# Altium footprint library Wurth_Elektronik_Electromechanic_Wire_to_Board_Connectors_rev16a.PCBLIB: 662 footprints (part 16 of 42)
Each footprint in its own frame and in the unit in brackets; x right, y up, seen from the top. Pads: shape width x height; smd on the part's side, far side on the other; paste and mask are expansions set on the pad; w line width, h text height; cw(c..) or ccw(c..) is an arc to the next point about the centre after c.
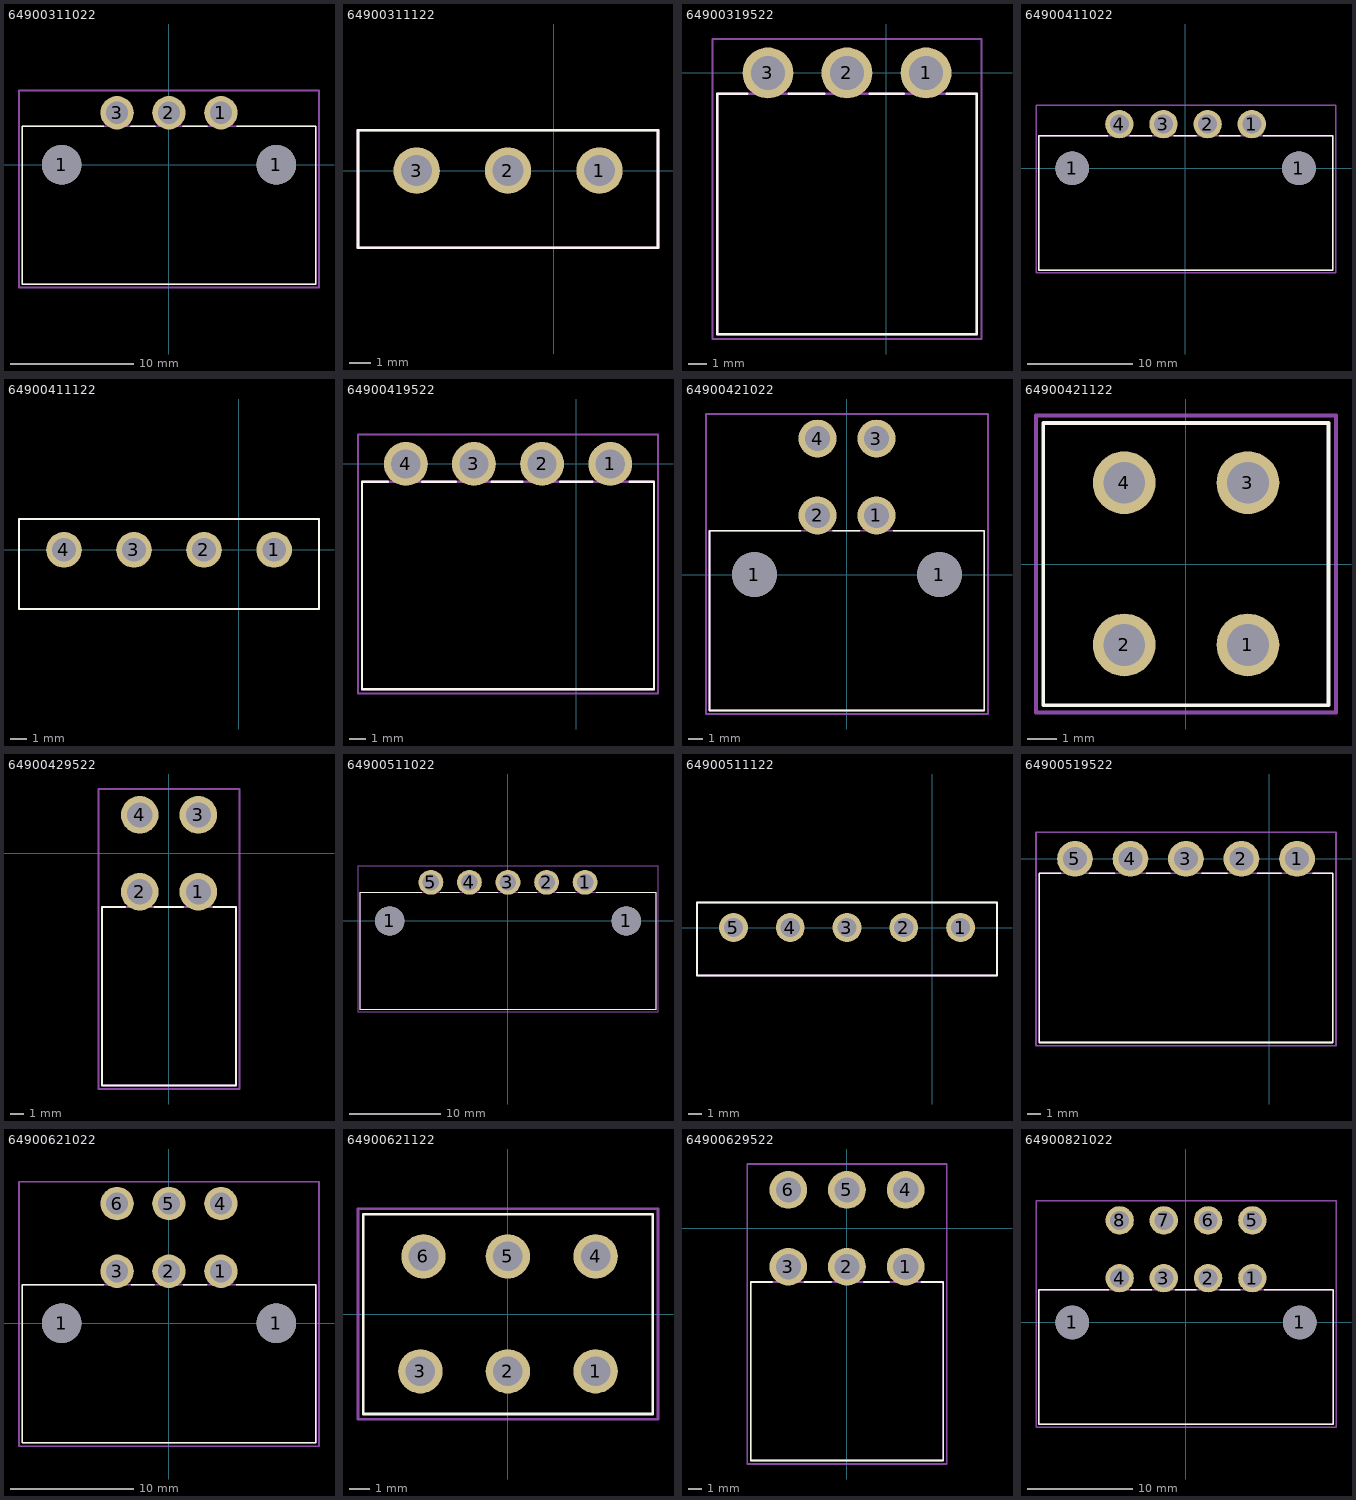
[diagram p15: the footprints below, top view; thin cyan lines are the x and y axes]

## 64900311022 [mil]
pads (5):
  round 126 hole 126: 1(-342.52,0) 1(343,0)
  round 106.5 hole 71: 1(166,166) 2(0,166) 3(-165.35,166)
Top Overlay:
  lines w5: -208.66,123 -468.5,123 -468.5,-381.89 469,-381.89 469,123 217,123 ; -122.05,123 -43.31,123 ; 44,123 123,123
Mechanical 2:
  text ">NAME" at -109.45,292 h77.5
Mechanical 4:
  text ">VALUE" at -142.32,-458.27 h77.5
Mechanical 16:
  lines w5: -468.5,-381.89 -468.5,123 469,123 469,-381.89 -468.5,-381.89
  text "1" at 158,141 h77.5
  text "3" at -192.32,141 h77.5
Mechanical 27:
  lines w5: -478.35,-391.73 479,-391.73 479,237 -478.35,237 -478.35,-391.73

## 64900311122 [mil]
pads (3):
  round 84 hole 56: 1(83,0) 2(-82.68,0) 3(-248.03,0)
Top Overlay:
  lines w5: -354.33,-139.76 189,-139.76 189,73 -354.33,73 -354.33,-139.76
Mechanical 2:
  text ">NAME" at -200,125 h77.5
Mechanical 4:
  text ">VALUE" at -225,-225 h77.5
Mechanical 16:
  lines w5: -354.33,-139.76 189,-139.76 189,73 -354.33,73 -354.33,-139.76
  text "1" at 75,-25 h77.5
  text "3" at -259.65,-25 h77.5

## 64900319522 [mil]
pads (3):
  round 106.5 hole 71: 1(83,0) 2(-82.68,0) 3(-248.03,0)
Top Overlay:
  lines w5: -291.34,-43.31 -354.33,-43.31 -354.33,-547.24 189,-547.24 189,-43.31 126,-43.31 ; -204.72,-43.31 -129.92,-43.31 ; -35.43,-43.31 36,-43.31
Mechanical 2:
  text ">NAME" at -225,115 h77.5
Mechanical 4:
  text ">VALUE" at -221.06,-631.5 h77.5
Mechanical 16:
  lines w5: -354.33,-547.24 -354.33,-43.31 189,-43.31 189,-547.24 -354.33,-547.24
  text "1" at 75,-25 h77.5
  text "3" at -275,-25 h77.5
Mechanical 27:
  lines w5: -364.17,-557.09 199,-557.09 199,71 -364.17,71 -364.17,-557.09

## 64900411022 [mil]
pads (6):
  round 126 hole 126: 1(-425.2,0) 1(426,0)
  round 106.5 hole 71: 1(249,166) 2(83,166) 3(-82.68,166) 4(-248.03,166)
Top Overlay:
  lines w5: -291.34,123 -551.18,123 -551.18,-381.89 552,-381.89 552,123 292,123 ; -208.66,123 -125.98,123 ; -43.31,123 40,123 ; 126,123 205,123
Mechanical 2:
  text ">NAME" at -159.65,266 h77.5
Mechanical 4:
  text ">VALUE" at -155.71,-470.08 h77.5
Mechanical 16:
  lines w5: -551.18,-381.89 -551.18,123 552,123 552,-381.89 -551.18,-381.89
  text "1" at 241,141 h77.5
  text "4" at -259.65,141 h77.5
Mechanical 27:
  lines w5: -561.02,-391.73 565,-391.73 565,237 -561.02,237 -561.02,-391.73

## 64900411122 [mil]
pads (4):
  round 84 hole 56: 1(83,0) 2(-82.68,0) 3(-248.03,0) 4(-413.39,0)
Top Overlay:
  lines w5: -519.68,-139.76 189,-139.76 189,73 -519.68,73 -519.68,-139.76
Mechanical 2:
  text ">NAME" at -275,125 h77.5
Mechanical 4:
  text ">VALUE" at -300,-225 h77.5
Mechanical 16:
  lines w5: -519.68,-139.76 189,-139.76 189,73 -519.68,73 -519.68,-139.76
  text "1" at 75,-25 h77.5
  text "4" at -425,-25 h77.5

## 64900419522 [mil]
pads (4):
  round 106.5 hole 71: 1(83,0) 2(-82.68,0) 3(-248.03,0) 4(-413.39,0)
Top Overlay:
  lines w5: -456.69,-43.31 -519.68,-43.31 -519.68,-547.24 189,-547.24 189,-43.31 130,-43.31 ; -374.02,-43.31 -291.34,-43.31 ; -204.72,-43.31 -129.92,-43.31 ; -39.37,-43.31 40,-43.31
Mechanical 2:
  text ">NAME" at -275,100 h77.5
Mechanical 4:
  text ">VALUE" at -296.06,-623.62 h77.5
Mechanical 16:
  lines w5: -519.68,-547.24 -519.68,-43.31 189,-43.31 189,-547.24 -519.68,-547.24
  text "1" at 75,-25 h77.5
  text "4" at -425,-25 h77.5
Mechanical 27:
  lines w5: -529.53,-557.09 199,-557.09 199,71 -529.53,71 -529.53,-557.09

## 64900421022 [mil]
pads (6):
  round 126 hole 126: 1(-259.84,0) 1(260,0)
  round 106.5 hole 71: 1(83,166) 2(-82.68,166) 3(83,382) 4(-82.68,382)
Top Overlay:
  lines w5: -385.83,123 -385.83,-381.89 386,-381.89 386,123 130,123 ; -383.86,123 -129.92,123 ; -39.37,123 36,123
Mechanical 2:
  text ">NAME" at -679.04,-135.24 h77.5
Mechanical 4:
  text ">VALUE" at -700,-226.38 h77.5
Mechanical 16:
  lines w5: -385.83,-381.89 386,-381.89 386,123 -385.83,123 -385.83,-381.89
  text "1" at 58,24 h77.5
  text "4" at -107.68,355 h77.5
Mechanical 27:
  lines w5: -395.67,-391.73 396,-391.73 396,451 -395.67,451 -395.67,-391.73

## 64900421122 [mil]
pads (4):
  round 84 hole 56: 1(83,-108.27) 2(-82.68,-108.27) 3(83,109) 4(-82.68,109)
Top Overlay:
  lines w5: -190.94,-188.98 191,-188.98 191,189 -190.94,189 -190.94,-188.98
Mechanical 2:
  text ">NAME" at -108.27,237 h77.5
Mechanical 4:
  text ">VALUE" at -127.95,-285.43 h77.5
Mechanical 16:
  text "1" at 58,-125 h77.5
  text "4" at -107.68,85 h77.5
Mechanical 27:
  lines w5: -200.79,-198.82 201,-198.82 201,199 -200.79,199 -200.79,-198.82

## 64900429522 [mil]
pads (4):
  round 106.5 hole 71: 1(83,-108.27) 2(-82.68,-108.27) 3(83,109) 4(-82.68,109)
Top Overlay:
  lines w5: -124.02,-151.57 -188.98,-151.57 -188.98,-655.51 189,-655.51 189,-151.57 125,-151.57 ; -41.34,-151.57 40,-151.57
Mechanical 2:
  text ">NAME" at -479.04,-358.86 h77.5
Mechanical 4:
  text ">VALUE" at -500,-450 h77.5
Mechanical 16:
  lines w5: -188.98,-655.51 189,-655.51 189,-151.57 -188.98,-151.57 -188.98,-655.51
  text "4" at -107.68,81 h77.5
  text "1" at 82,-133.86 h77.5
Mechanical 27:
  lines w5: -198.82,-665.35 199,-665.35 199,182 -198.82,182 -198.82,-665.35

## 64900511022 [mil]
pads (7):
  round 126 hole 126: 1(-507.87,0) 1(508,0)
  round 106.5 hole 71: 1(331,166) 2(166,166) 3(0,166) 4(-165.35,166) 5(-330.71,166)
Top Overlay:
  lines w5: -370.08,123 -633.86,123 -633.86,-381.89 634,-381.89 634,123 378,123 ; -291.34,123 -208.66,123 ; -125.98,123 -43.31,123 ; 44,123 123,123 ; 209,123 288,123
Mechanical 2:
  text ">NAME" at -76.97,266 h77.5
Mechanical 4:
  text ">VALUE" at -92.72,-466.14 h77.5
Mechanical 16:
  lines w5: -633.86,-381.89 -633.86,123 634,123 634,-381.89 -633.86,-381.89
  text "1" at 324,141 h77.5
  text "5" at -351.97,141 h77.5
Mechanical 27:
  lines w5: -643.7,-391.73 644,-391.73 644,237 -643.7,237 -643.7,-391.73

## 64900511122 [mil]
pads (5):
  round 84 hole 56: 1(83,0) 2(-82.68,0) 3(-248.03,0) 4(-413.39,0) 5(-578.74,0)
Top Overlay:
  lines w5: -685.04,-139.76 189,-139.76 189,73 -685.04,73 -685.04,-139.76
Mechanical 2:
  text ">NAME" at -325,125 h77.5
Mechanical 4:
  text ">VALUE" at -350,-275 h77.5
Mechanical 16:
  lines w5: -685.04,-139.76 189,-139.76 189,73 -685.04,73 -685.04,-139.76
  text "1" at 75,-25 h77.5
  text "5" at -600,-25 h77.5

## 64900519522 [mil]
pads (5):
  round 106.5 hole 71: 1(83,0) 2(-82.68,0) 3(-248.03,0) 4(-413.39,0) 5(-578.74,0)
Top Overlay:
  lines w5: -622.05,-43.31 -685.04,-43.31 -685.04,-547.24 189,-547.24 189,-43.31 130,-43.31 ; -535.43,-43.31 -460.63,-43.31 ; -366.14,-43.31 -295.28,-43.31 ; -200.79,-43.31 -125.98,-43.31 ; -35.43,-43.31 36,-43.31
Mechanical 2:
  text ">NAME" at -400,100 h77.5
Mechanical 4:
  text ">VALUE" at -407.87,-627.56 h77.5
Mechanical 16:
  lines w5: -685.04,-547.24 -685.04,-43.31 189,-43.31 189,-547.24 -685.04,-547.24
  text "1" at 75,-25 h77.5
  text "5" at -600,-25 h77.5
Mechanical 27:
  lines w5: -694.88,-557.09 199,-557.09 199,79 -694.88,79 -694.88,-557.09

## 64900621022 [mil]
pads (8):
  round 126 hole 126: 1(-342.52,0) 1(343,0)
  round 106.5 hole 71: 1(166,166) 2(0,166) 3(-165.35,166) 4(166,382) 5(0,382) 6(-165.35,382)
Top Overlay:
  lines w5: -208.66,123 -468.5,123 -468.5,-381.89 469,-381.89 469,123 215,123 ; -120.08,123 -47.24,123 ; 46,123 121,123
Mechanical 2:
  text ">NAME" at -771.36,-110.24 h77.5
Mechanical 4:
  text ">VALUE" at -771.36,-189.67 h77.5
Mechanical 16:
  lines w5: -468.5,-381.89 470,-381.89 470,123 -468.5,123 -468.5,-381.89
  text "1" at 141,24 h77.5
  text "6" at -192.91,349 h77.5
Mechanical 27:
  lines w5: -478.35,-391.73 479,-391.73 479,451 -478.35,451 -478.35,-391.73

## 64900621122 [mil]
pads (6):
  round 84 hole 56: 1(166,-108.27) 2(0,-108.27) 3(-165.35,-108.27) 4(166,109) 5(0,109) 6(-159.65,109)
Top Overlay:
  lines w5: -273.62,-188.98 274,-188.98 274,189 -273.62,189 -273.62,-188.98
Mechanical 2:
  text ">NAME" at -108.27,237 h77.5
Mechanical 4:
  text ">VALUE" at -127.95,-285.43 h77.5
Mechanical 16:
  text "1" at 141,-125 h77.5
  text "6" at -175,85 h77.5
Mechanical 27:
  lines w5: -283.46,-198.82 284,-198.82 284,199 -283.46,199 -283.46,-198.82

## 64900629522 [mil]
pads (6):
  round 106.5 hole 71: 1(166,-108.27) 2(0,-108.27) 3(-165.35,-108.27) 4(166,109) 5(0,109) 6(-165.35,109)
Top Overlay:
  lines w5: -210.63,-151.57 -271.65,-151.57 -271.65,-655.51 272,-655.51 272,-151.57 ; -120.08,-151.57 -45.28,-151.57 ; 48,-151.57 119,-151.57 ; 211,-151.57 270,-151.57 270,-153.54
Mechanical 2:
  text ">NAME" at -596.36,-358.86 h77.5
Mechanical 4:
  text ">VALUE" at -596.36,-438.29 h77.5
Mechanical 16:
  lines w5: -271.65,-655.51 272,-655.51 272,-151.57 -271.65,-151.57 -271.65,-655.51
  text "6" at -192.91,75 h77.5
  text "1" at 164,-133.86 h77.5
Mechanical 27:
  lines w5: -281.5,-665.35 282,-665.35 282,182 -281.5,182 -281.5,-665.35

## 64900821022 [mil]
pads (10):
  round 126 hole 126: 1(-425.2,0) 1(426,0)
  round 106.5 hole 71: 1(249,166) 2(83,166) 3(-82.68,166) 4(-248.03,166) 5(249,382) 6(83,382) 7(-82.68,382) 8(-248.03,382)
Top Overlay:
  lines w5: -289.37,123 -551.18,123 -551.18,-381.89 552,-381.89 552,123 294,123 ; -206.69,123 -127.95,123 ; -39.37,123 38,123 ; 126,123 203,123
Mechanical 2:
  text ">NAME" at -838.68,-110.24 h77.5
Mechanical 4:
  text ">VALUE" at -863.68,-189.67 h77.5
Mechanical 16:
  lines w5: -551.18,-381.89 552,-381.89 552,123 -551.18,123 -551.18,-381.89
  text "1" at 224,24 h77.5
  text "8" at -260.24,349 h77.5
Mechanical 27:
  lines w5: -561.02,-391.73 562,-391.73 562,455 -561.02,455 -561.02,-391.73